# Altium footprint library Tomra_Cadstar_Footprints.PcbLib: 380 footprints (part 13 of 24)
Each footprint in its own frame and in the unit in brackets; x right, y up, seen from the top. Pads: shape width x height; smd on the part's side, far side on the other; paste and mask are expansions set on the pad; w line width, h text height; cw(c..) or ccw(c..) is an arc to the next point about the centre after c.
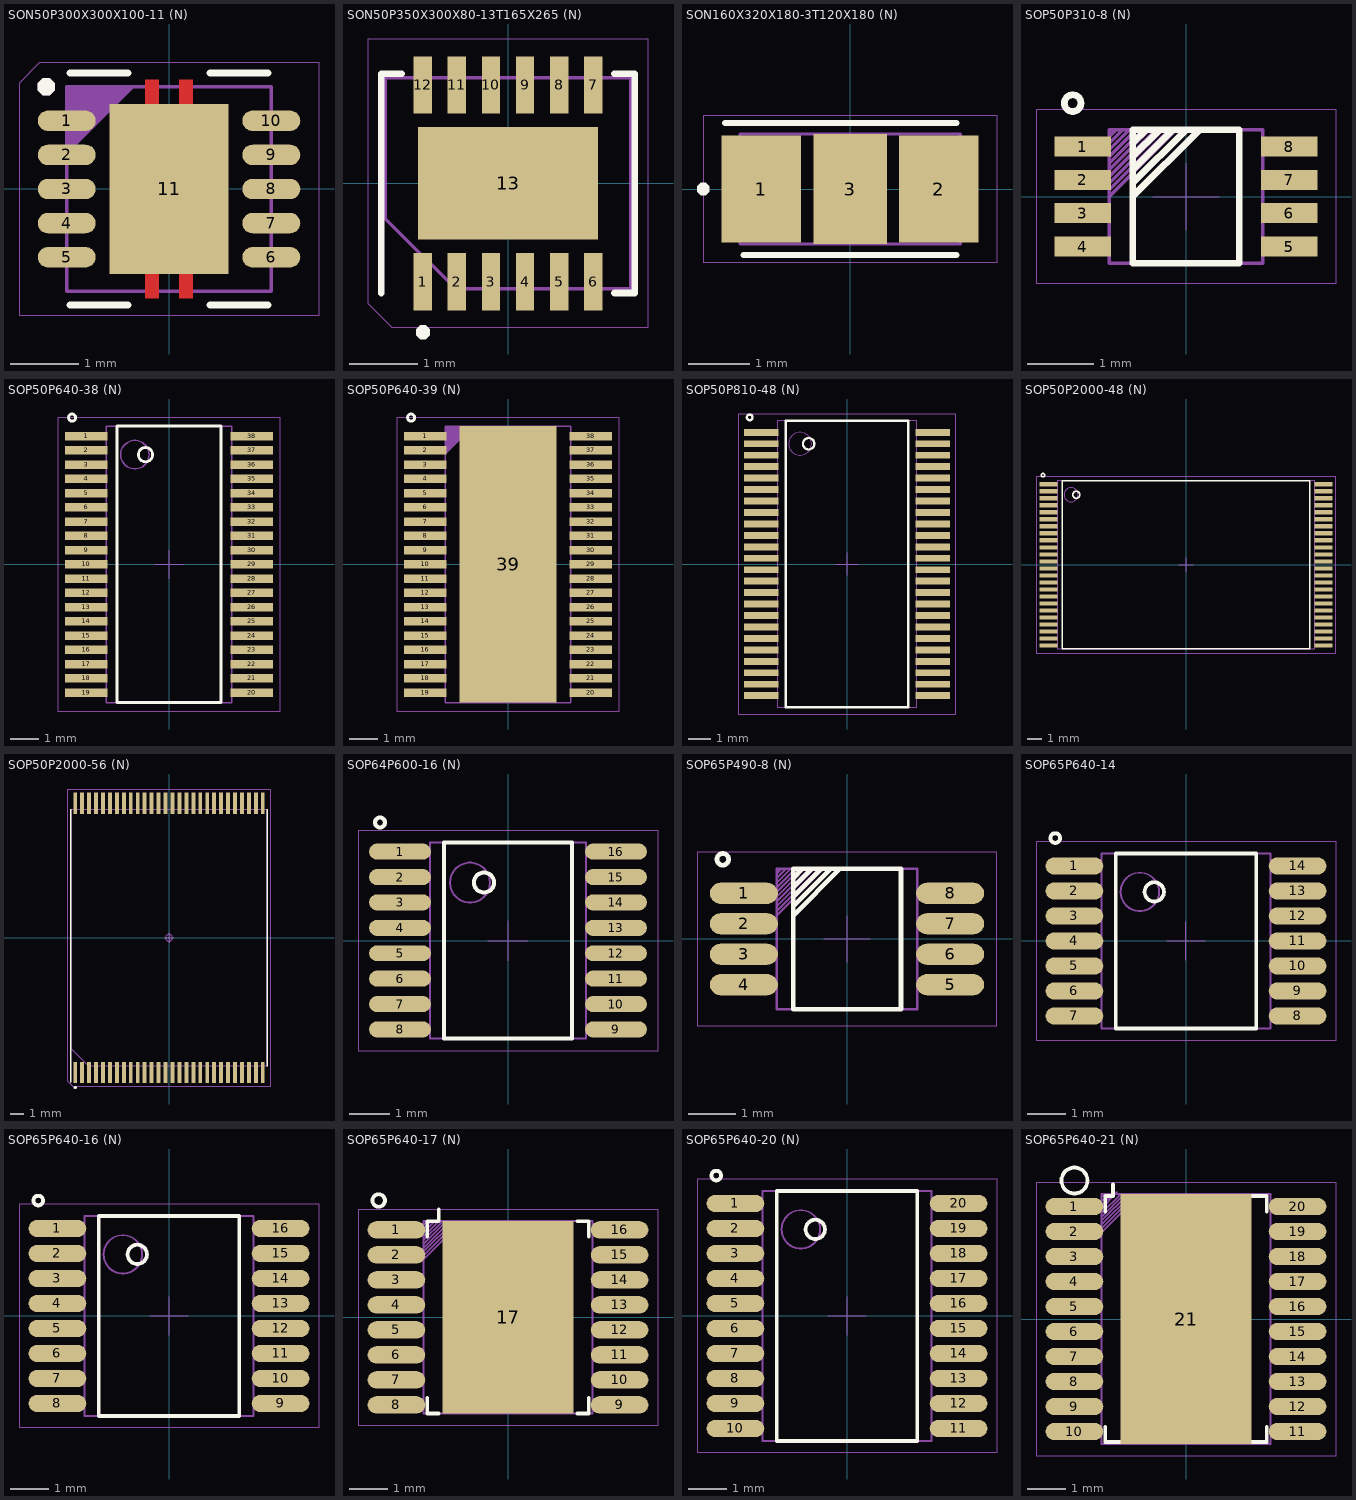
[diagram p12: the footprints below, top view; thin cyan lines are the x and y axes]

## SON50P300X300X100-11 (N) [mm]
height 1
pads (11):
  oval 0.85x0.3 smd paste+0 mask+0: 1(-1.5,1) 2(-1.5,0.5) 3(-1.5,0) 4(-1.5,-0.5) 5(-1.5,-1) 6(1.5,-1) 7(1.5,-0.5) 8(1.5,0) 9(1.5,0.5) 10(1.5,1)
  rect 1.75x2.5 smd paste-0.75 mask+0: 11(0,0)
Top Elec:
  region: -0.8,-1.15 -0.35,-1.15 -0.35,-1.6 -0.15,-1.6 -0.15,-1.15 0.15,-1.15 0.15,-1.6 0.35,-1.6 0.35,-1.15 0.8,-1.15 0.8,1.15 0.35,1.15 0.35,1.6 0.15,1.6 0.15,1.15 -0.15,1.15 -0.15,1.6 -0.35,1.6 -0.35,1.15 -0.8,1.15
Top Silk:
  region: -1.925,1.5 -1.925,1.552 -1.852,1.625 -1.748,1.625 -1.675,1.552 -1.675,1.5 -1.675,1.448 -1.748,1.375 -1.852,1.375 -1.925,1.448
  lines w0.1: -1.45,-1.7 -0.6,-1.7 ; -1.45,1.7 -0.6,1.7 ; 0.6,-1.7 1.45,-1.7 ; 0.6,1.7 1.45,1.7
  text ".Designator" at -3.599,-0.35 h0.7
Top Solder Resist:
  region: -0.8,-1.15 -0.35,-1.15 -0.35,-1.6 -0.15,-1.6 -0.15,-1.15 0.15,-1.15 0.15,-1.6 0.35,-1.6 0.35,-1.15 0.8,-1.15 0.8,1.15 0.35,1.15 0.35,1.6 0.15,1.6 0.15,1.15 -0.15,1.15 -0.15,1.6 -0.35,1.6 -0.35,1.15 -0.8,1.15
Top Assembly:
  region: -1.5,1.5 -0.5,1.5 -1.5,0.5
  region: -1.925,1.5 -1.925,1.552 -1.852,1.625 -1.748,1.625 -1.675,1.552 -1.675,1.5 -1.675,1.448 -1.748,1.375 -1.852,1.375 -1.925,1.448
  lines w0.05: -1.5,-1.5 -1.5,1.5 1.5,1.5 1.5,-1.5 -1.5,-1.5
Top Placement:
  lines w0.01: -0.5,0 0.5,0 ; 0,-0.5 0,0.5 ; -2.2,-1.85 2.2,-1.85 2.2,1.85 -1.9,1.85 -2.2,1.55 -2.2,-1.85

## SON50P350X300X80-13T165X265 (N) [mm]
height 0.8
pads (13):
  rect 0.27x0.84 smd paste+0 mask+0: 1(-1.25,-1.445) 2(-0.75,-1.445) 3(-0.25,-1.445) 4(0.25,-1.445) 5(0.75,-1.445) 6(1.25,-1.445) 7(1.25,1.445) 8(0.75,1.445) 9(0.25,1.445) 10(-0.25,1.445) 11(-0.75,1.445) 12(-1.25,1.445)
  rect 2.65x1.65 smd paste+0 mask+0: 13(0,0)
Top Silk:
  region: -1.35,-2.185 -1.35,-2.144 -1.291,-2.085 -1.209,-2.085 -1.15,-2.144 -1.15,-2.185 -1.15,-2.226 -1.209,-2.285 -1.291,-2.285 -1.35,-2.226
  lines w0.1: -1.86,-1.61 -1.86,1.61 -1.565,1.61 ; 1.565,-1.61 1.86,-1.61 1.86,1.61 1.565,1.61
  text ".Designator" at -2.05,2.12 h0.7
Top Paste:
  region: 1.13,-0.63 0.1,-0.63 0.1,-0.1 1.13,-0.1
  region: 1.13,0.1 0.1,0.1 0.1,0.63 1.13,0.63
  region: -0.1,-0.63 -1.13,-0.63 -1.13,-0.1 -0.1,-0.1
  region: -0.1,0.1 -1.13,0.1 -1.13,0.63 -0.1,0.63
Top Assembly:
  lines w0.05: -1.8,-0.517 -0.767,-1.55 1.8,-1.55 1.8,1.55 -1.8,1.55 -1.8,-0.517
Top Placement:
  lines w0.01: -2.05,-1.77 -1.7,-2.12 2.05,-2.12 2.05,2.12 -2.05,2.12 -2.05,-1.77
  lines w0.05: -0.35,0 0.35,0 ; 0,-0.35 0,0.35 ; -0.25,0 cw(c0,0) 0.25,0 cw(c0,0) -0.25,0

## SON160X320X180-3T120X180 (N) [mm]
height 1.8
pads (3):
  rrect0% 1.3x1.74 smd paste+0 mask+0: 1(-1.45,0) 2(1.45,0)
  rect 1.2x1.8 smd paste+0 mask+0: 3(0,0)
Top Silk:
  region: -2.4,0.1 -2.359,0.1 -2.3,0.041 -2.3,-0.041 -2.359,-0.1 -2.4,-0.1 -2.441,-0.1 -2.5,-0.041 -2.5,0.041 -2.441,0.1
  lines w0.1: -2.04,1.08 1.74,1.08 ; -1.74,-1.08 1.74,-1.08
  text ".Designator" at -3.599,-0.35 h0.7
Top Paste:
  region: -0.39,-0.76 -0.39,-0.07 0.39,-0.07 0.39,-0.76
  region: -0.39,0.07 -0.39,0.76 0.39,0.76 0.39,0.07
Top Assembly:
  lines w0.05: -1.8,-0.9 -1.8,0.9 1.8,0.9 1.8,-0.9 -1.8,-0.9
Top Placement:
  lines w0.01: -2.4,-1.2 -2.4,1.2 2.4,1.2 2.4,-1.2 -2.4,-1.2
  lines w0.05: 0,-0.25 ccw(c0,0) 0,0.25 ; 0,-0.25 cw(c0,0) 0,0.25 ; 0,-0.25 ccw(c0,0) 0,0.25 ; 0,-0.25 cw(c0,0) 0,0.25 ; -0.35,0 0.35,0 -0.35,0 ; 0,-0.35 0,0.35 0,-0.35

## SOP50P310-8 (N) [mm]
height 0.9
pads (8):
  rect 0.85x0.3 smd paste+0 mask+0: 1(-1.55,0.75) 2(-1.55,0.25) 3(-1.55,-0.25) 4(-1.55,-0.75) 5(1.55,-0.75) 6(1.55,-0.25) 7(1.55,0.25) 8(1.55,0.75)
Top Silk:
  lines w0.1: -0.8,0 0.2,1 ; -0.8,0.2 0,1 ; -0.8,0.4 -0.2,1 ; -0.8,0.6 -0.4,1 ; -0.8,0.8 -0.6,1 ; -1.825,1.4 cw(c-1.7,1.4) -1.575,1.4 cw(c-1.7,1.4) -1.825,1.4 ; -0.8,-1 0.8,-1 0.8,1 -0.8,1 -0.8,-1
  text ".Designator" at -3.599,-0.35 h0.7
Top Assembly:
  lines w0.05: -1.15,0 -0.15,1 ; -1.15,0.1 -0.25,1 ; -1.15,0.2 -0.35,1 ; -1.15,0.3 -0.45,1 ; -1.15,0.4 -0.55,1 ; -1.15,0.5 -0.65,1 ; -1.15,0.6 -0.75,1 ; -1.15,0.7 -0.85,1 ; -1.15,0.8 -0.95,1 ; -1.15,0.9 -1.05,1 ; -1.15,-1 1.15,-1 1.15,1 -1.15,1 -1.15,-1
Top Placement:
  lines w0.01: -0.5,0 0.5,0 ; 0,-0.5 0,0.5 ; -2.25,-1.3 2.25,-1.3 2.25,1.3 -2.25,1.3 -2.25,-1.3

## SOP50P640-38 (N) [mm]
height 1.2
pads (38):
  rect 1.5x0.3 smd paste+0 mask+0: 1(-2.9,4.5) 2(-2.9,4) 3(-2.9,3.5) 4(-2.9,3) 5(-2.9,2.5) 6(-2.9,2) 7(-2.9,1.5) 8(-2.9,1) 9(-2.9,0.5) 10(-2.9,0) 11(-2.9,-0.5) 12(-2.9,-1) 13(-2.9,-1.5) 14(-2.9,-2) 15(-2.9,-2.5) 16(-2.9,-3) 17(-2.9,-3.5) 18(-2.9,-4) 19(-2.9,-4.5) 20(2.9,-4.5) 21(2.9,-4) 22(2.9,-3.5) 23(2.9,-3) 24(2.9,-2.5) 25(2.9,-2) 26(2.9,-1.5) 27(2.9,-1) 28(2.9,-0.5) 29(2.9,0) 30(2.9,0.5) 31(2.9,1) 32(2.9,1.5) 33(2.9,2) 34(2.9,2.5) 35(2.9,3) 36(2.9,3.5) 37(2.9,4) 38(2.9,4.5)
Top Silk:
  lines w0.1: -3.525,5.15 cw(c-3.4,5.15) -3.275,5.15 cw(c-3.4,5.15) -3.525,5.15 ; -1.825,-4.85 1.825,-4.85 1.825,4.85 -1.825,4.85 -1.825,-4.85 ; -1.075,3.85 cw(c-0.825,3.85) -0.575,3.85 cw(c-0.825,3.85) -1.075,3.85
  text ".Designator" at -3.599,-0.35 h0.7
Top Assembly:
  lines w0.05: -2.2,-4.85 2.2,-4.85 2.2,4.85 -2.2,4.85 -2.2,-4.85 ; -1.7,3.85 cw(c-1.2,3.85) -0.7,3.85 cw(c-1.2,3.85) -1.7,3.85
Top Placement:
  lines w0.01: -0.5,0 0.5,0 ; 0,-0.5 0,0.5 ; -3.9,-5.15 3.9,-5.15 3.9,5.15 -3.9,5.15 -3.9,-5.15

## SOP50P640-39 (N) [mm]
height 1.2
pads (39):
  rect 1.5x0.3 smd paste+0 mask+0: 1(-2.9,4.5) 2(-2.9,4) 3(-2.9,3.5) 4(-2.9,3) 5(-2.9,2.5) 6(-2.9,2) 7(-2.9,1.5) 8(-2.9,1) 9(-2.9,0.5) 10(-2.9,0) 11(-2.9,-0.5) 12(-2.9,-1) 13(-2.9,-1.5) 14(-2.9,-2) 15(-2.9,-2.5) 16(-2.9,-3) 17(-2.9,-3.5) 18(-2.9,-4) 19(-2.9,-4.5) 20(2.9,-4.5) 21(2.9,-4) 22(2.9,-3.5) 23(2.9,-3) 24(2.9,-2.5) 25(2.9,-2) 26(2.9,-1.5) 27(2.9,-1) 28(2.9,-0.5) 29(2.9,0) 30(2.9,0.5) 31(2.9,1) 32(2.9,1.5) 33(2.9,2) 34(2.9,2.5) 35(2.9,3) 36(2.9,3.5) 37(2.9,4) 38(2.9,4.5)
  rect 3.4x9.7 smd paste+0 mask+0: 39(0,0)
Top Silk:
  lines w0.1: -3.525,5.15 cw(c-3.4,5.15) -3.275,5.15 cw(c-3.4,5.15) -3.525,5.15
  text ".Designator" at -3.9,5.15 h0.7
Top Assembly:
  region: -2.2,4.85 -2.2,3.85 -1.2,4.85 -1.575,4.85
  lines w0.05: -2.2,-4.85 2.2,-4.85 2.2,4.85 -2.2,4.85 -2.2,-4.85
Top Placement:
  lines w0.01: -0.5,0 0.5,0 ; 0,-0.5 0,0.5 ; -3.9,-5.15 3.9,-5.15 3.9,5.15 -3.9,5.15 -3.9,-5.15

## SOP50P810-48 (N) [mm]
height 1.2
pads (48):
  rect 1.5x0.3 smd paste+0 mask+0: 1(-3.75,5.75) 2(-3.75,5.25) 3(-3.75,4.75) 4(-3.75,4.25) 5(-3.75,3.75) 6(-3.75,3.25) 7(-3.75,2.75) 8(-3.75,2.25) 9(-3.75,1.75) 10(-3.75,1.25) 11(-3.75,0.75) 12(-3.75,0.25) 13(-3.75,-0.25) 14(-3.75,-0.75) 15(-3.75,-1.25) 16(-3.75,-1.75) 17(-3.75,-2.25) 18(-3.75,-2.75) 19(-3.75,-3.25) 20(-3.75,-3.75) 21(-3.75,-4.25) 22(-3.75,-4.75) 23(-3.75,-5.25) 24(-3.75,-5.75) 25(3.75,-5.75) 26(3.75,-5.25) 27(3.75,-4.75) 28(3.75,-4.25) 29(3.75,-3.75) 30(3.75,-3.25) 31(3.75,-2.75) 32(3.75,-2.25) 33(3.75,-1.75) 34(3.75,-1.25) 35(3.75,-0.75) 36(3.75,-0.25) 37(3.75,0.25) 38(3.75,0.75) 39(3.75,1.25) 40(3.75,1.75) 41(3.75,2.25) 42(3.75,2.75) 43(3.75,3.25) 44(3.75,3.75) 45(3.75,4.25) 46(3.75,4.75) 47(3.75,5.25) 48(3.75,5.75)
Top Silk:
  lines w0.1: -4.375,6.4 cw(c-4.25,6.4) -4.125,6.4 cw(c-4.25,6.4) -4.375,6.4 ; -2.675,-6.25 2.675,-6.25 2.675,6.25 -2.675,6.25 -2.675,-6.25 ; -1.925,5.25 cw(c-1.675,5.25) -1.425,5.25 cw(c-1.675,5.25) -1.925,5.25
  text ".Designator" at -3.599,-0.35 h0.7
Top Assembly:
  lines w0.05: -3.05,-6.25 3.05,-6.25 3.05,6.25 -3.05,6.25 -3.05,-6.25 ; -2.55,5.25 cw(c-2.05,5.25) -1.55,5.25 cw(c-2.05,5.25) -2.55,5.25
Top Placement:
  lines w0.01: -0.5,0 0.5,0 ; 0,-0.5 0,0.5 ; -4.75,-6.55 4.75,-6.55 4.75,6.55 -4.75,6.55 -4.75,-6.55

## SOP50P2000-48 (N) [mm]
height 1.2
pads (48):
  rect 1.3x0.3 smd paste+0 mask+0: 1(-9.8,5.75) 2(-9.8,5.25) 3(-9.8,4.75) 4(-9.8,4.25) 5(-9.8,3.75) 6(-9.8,3.25) 7(-9.8,2.75) 8(-9.8,2.25) 9(-9.8,1.75) 10(-9.8,1.25) 11(-9.8,0.75) 12(-9.8,0.25) 13(-9.8,-0.25) 14(-9.8,-0.75) 15(-9.8,-1.25) 16(-9.8,-1.75) 17(-9.8,-2.25) 18(-9.8,-2.75) 19(-9.8,-3.25) 20(-9.8,-3.75) 21(-9.8,-4.25) 22(-9.8,-4.75) 23(-9.8,-5.25) 24(-9.8,-5.75) 25(9.8,-5.75) 26(9.8,-5.25) 27(9.8,-4.75) 28(9.8,-4.25) 29(9.8,-3.75) 30(9.8,-3.25) 31(9.8,-2.75) 32(9.8,-2.25) 33(9.8,-1.75) 34(9.8,-1.25) 35(9.8,-0.75) 36(9.8,-0.25) 37(9.8,0.25) 38(9.8,0.75) 39(9.8,1.25) 40(9.8,1.75) 41(9.8,2.25) 42(9.8,2.75) 43(9.8,3.25) 44(9.8,3.75) 45(9.8,4.25) 46(9.8,4.75) 47(9.8,5.25) 48(9.8,5.75)
Top Silk:
  lines w0.1: -10.325,6.4 cw(c-10.2,6.4) -10.075,6.4 cw(c-10.2,6.4) -10.325,6.4 ; -8.825,-6 8.825,-6 8.825,6 -8.825,6 -8.825,-6 ; -8.075,5 cw(c-7.825,5) -7.575,5 cw(c-7.825,5) -8.075,5
  text ".Designator" at -8.825,6 h0.7
Top Assembly:
  lines w0.05: -9.2,-6 9.2,-6 9.2,6 -9.2,6 -9.2,-6 ; -8.7,5 cw(c-8.2,5) -7.7,5 cw(c-8.2,5) -8.7,5
Top Placement:
  lines w0.01: -0.5,0 0.5,0 ; 0,-0.5 0,0.5 ; -10.7,-6.3 10.7,-6.3 10.7,6.3 -10.7,6.3 -10.7,-6.3

## SOP50P2000-56 (N) [mm]
height 1.2
pads (56):
  rect 0.28x1.54 smd paste+0 mask+0: 1(-6.75,-9.69) 2(-6.25,-9.69) 3(-5.75,-9.69) 4(-5.25,-9.69) 5(-4.75,-9.69) 6(-4.25,-9.69) 7(-3.75,-9.69) 8(-3.25,-9.69) 9(-2.75,-9.69) 10(-2.25,-9.69) 11(-1.75,-9.69) 12(-1.25,-9.69) 13(-0.75,-9.69) 14(-0.25,-9.69) 15(0.25,-9.69) 16(0.75,-9.69) 17(1.25,-9.69) 18(1.75,-9.69) 19(2.25,-9.69) 20(2.75,-9.69) 21(3.25,-9.69) 22(3.75,-9.69) 23(4.25,-9.69) 24(4.75,-9.69) 25(5.25,-9.69) 26(5.75,-9.69) 27(6.25,-9.69) 28(6.75,-9.69) 29(6.75,9.69) 30(6.25,9.69) 31(5.75,9.69) 32(5.25,9.69) 33(4.75,9.69) 34(4.25,9.69) 35(3.75,9.69) 36(3.25,9.69) 37(2.75,9.69) 38(2.25,9.69) 39(1.75,9.69) 40(1.25,9.69) 41(0.75,9.69) 42(0.25,9.69) 43(-0.25,9.69) 44(-0.75,9.69) 45(-1.25,9.69) 46(-1.75,9.69) 47(-2.25,9.69) 48(-2.75,9.69) 49(-3.25,9.69) 50(-3.75,9.69) 51(-4.25,9.69) 52(-4.75,9.69) 53(-5.25,9.69) 54(-5.75,9.69) 55(-6.25,9.69) 56(-6.75,9.69)
Top Silk:
  region: -6.85,-10.78 -6.85,-10.739 -6.791,-10.68 -6.709,-10.68 -6.65,-10.739 -6.65,-10.78 -6.65,-10.821 -6.709,-10.88 -6.791,-10.88 -6.85,-10.821
  lines w0.1: -7.07,-10.4 -7.07,9.25 ; 7.07,-9.25 7.07,9.25
  text ".Designator" at 0,0 h0.7
Top Assembly:
  lines w0.05: -7.05,-7.98 -5.78,-9.25 7.05,-9.25 7.05,9.25 -7.05,9.25 -7.05,-7.98
Top Placement:
  lines w0.01: -7.3,-10.31 -6.9,-10.71 7.3,-10.71 7.3,10.71 -7.3,10.71 -7.3,-10.31
  lines w0.05: -0.35,0 0.35,0 ; 0,-0.35 0,0.35 ; -0.25,0 cw(c0,0) 0.25,0 cw(c0,0) -0.25,0

## SOP64P600-16 (N) [mm]
height 1.75
pads (16):
  oval 1.55x0.4 smd paste+0 mask+0: 1(-2.7,2.222) 2(-2.7,1.587) 3(-2.7,0.953) 4(-2.7,0.318) 5(-2.7,-0.318) 6(-2.7,-0.953) 7(-2.7,-1.587) 8(-2.7,-2.222) 9(2.7,-2.222) 10(2.7,-1.587) 11(2.7,-0.953) 12(2.7,-0.318) 13(2.7,0.318) 14(2.7,0.953) 15(2.7,1.587) 16(2.7,2.222)
Top Silk:
  lines w0.1: -3.325,2.95 cw(c-3.2,2.95) -3.075,2.95 cw(c-3.2,2.95) -3.325,2.95 ; -1.6,-2.45 1.6,-2.45 1.6,2.45 -1.6,2.45 -1.6,-2.45 ; -0.85,1.45 cw(c-0.6,1.45) -0.35,1.45 cw(c-0.6,1.45) -0.85,1.45
  text ".Designator" at -3.599,-0.35 h0.7
Top Assembly:
  lines w0.05: -1.95,-2.448 1.95,-2.448 1.95,2.447 -1.95,2.447 -1.95,-2.448 ; -1.45,1.448 cw(c-0.95,1.448) -0.45,1.448 cw(c-0.95,1.448) -1.45,1.448
Top Placement:
  lines w0.01: -0.5,0 0.5,0 ; 0,-0.5 0,0.5 ; -3.75,-2.75 3.75,-2.75 3.75,2.75 -3.75,2.75 -3.75,-2.75

## SOP65P490-8 (N) [mm]
height 0.95
pads (8):
  oval 1.45x0.45 smd paste+0 mask+0: 1(-2.2,0.975) 2(-2.2,0.325) 3(-2.2,-0.325) 4(-2.2,-0.975) 5(2.2,-0.975) 6(2.2,-0.325) 7(2.2,0.325) 8(2.2,0.975)
Top Silk:
  lines w0.1: -1.15,0.5 -0.15,1.5 ; -1.15,0.7 -0.35,1.5 ; -1.15,0.9 -0.55,1.5 ; -1.15,1.1 -0.75,1.5 ; -1.15,1.3 -0.95,1.5 ; -2.775,1.7 cw(c-2.65,1.7) -2.525,1.7 cw(c-2.65,1.7) -2.775,1.7 ; -1.15,-1.5 1.15,-1.5 1.15,1.5 -1.15,1.5 -1.15,-1.5
  text ".Designator" at -3.599,-0.35 h0.7
Top Assembly:
  lines w0.05: -1.5,0.5 -0.5,1.5 ; -1.5,0.6 -0.6,1.5 ; -1.5,0.7 -0.7,1.5 ; -1.5,0.8 -0.8,1.5 ; -1.5,0.9 -0.9,1.5 ; -1.5,1 -1,1.5 ; -1.5,1.1 -1.1,1.5 ; -1.5,1.2 -1.2,1.5 ; -1.5,1.3 -1.3,1.5 ; -1.5,1.4 -1.4,1.5 ; -1.5,-1.5 -1.5,1.5 1.5,1.5 1.5,-1.5 -1.5,-1.5
Top Placement:
  lines w0.01: -0.5,0 0.5,0 ; 0,-0.5 0,0.5 ; -3.2,-1.85 3.2,-1.85 3.2,1.85 -3.2,1.85 -3.2,-1.85

## SOP65P640-14 [mm]
height 1.1
pads (14):
  oval 1.5x0.45 smd paste+0 mask+0: 1(-2.9,1.95) 2(-2.9,1.3) 3(-2.9,0.65) 4(-2.9,0) 5(-2.9,-0.65) 6(-2.9,-1.3) 7(-2.9,-1.95) 8(2.9,-1.95) 9(2.9,-1.3) 10(2.9,-0.65) 11(2.9,0) 12(2.9,0.65) 13(2.9,1.3) 14(2.9,1.95)
Top Silk:
  lines w0.1: -3.525,2.675 cw(c-3.4,2.675) -3.275,2.675 cw(c-3.4,2.675) -3.525,2.675 ; -1.825,-2.275 1.825,-2.275 1.825,2.275 -1.825,2.275 -1.825,-2.275 ; -1.075,1.275 cw(c-0.825,1.275) -0.575,1.275 cw(c-0.825,1.275) -1.075,1.275
  text ".Designator" at -3.594,-0.35 h0.7
Top Assembly:
  lines w0.05: -2.2,-2.275 2.2,-2.275 2.2,2.275 -2.2,2.275 -2.2,-2.275 ; -1.7,1.275 cw(c-1.2,1.275) -0.7,1.275 cw(c-1.2,1.275) -1.7,1.275
Top Placement:
  lines w0.01: -0.505,0 0.495,0 ; -0.005,-0.5 -0.005,0.5 ; -3.9,-2.58 3.9,-2.58 3.9,2.575 -3.9,2.575 -3.9,-2.58

## SOP65P640-16 (N) [mm]
height 1.5
pads (16):
  oval 1.5x0.45 smd paste+0 mask+0: 1(-2.9,2.275) 2(-2.9,1.625) 3(-2.9,0.975) 4(-2.9,0.325) 5(-2.9,-0.325) 6(-2.9,-0.975) 7(-2.9,-1.625) 8(-2.9,-2.275) 9(2.9,-2.275) 10(2.9,-1.625) 11(2.9,-0.975) 12(2.9,-0.325) 13(2.9,0.325) 14(2.9,0.975) 15(2.9,1.625) 16(2.9,2.275)
Top Silk:
  lines w0.1: -3.525,3 cw(c-3.4,3) -3.275,3 cw(c-3.4,3) -3.525,3 ; -1.825,-2.6 1.825,-2.6 1.825,2.6 -1.825,2.6 -1.825,-2.6 ; -1.075,1.6 cw(c-0.825,1.6) -0.575,1.6 cw(c-0.825,1.6) -1.075,1.6
  text ".Designator" at -3.599,-0.35 h0.7
Top Assembly:
  lines w0.05: -2.2,-2.6 2.2,-2.6 2.2,2.6 -2.2,2.6 -2.2,-2.6 ; -1.7,1.6 cw(c-1.2,1.6) -0.7,1.6 cw(c-1.2,1.6) -1.7,1.6
Top Placement:
  lines w0.01: -0.5,0 0.5,0 ; 0,-0.5 0,0.5 ; -3.9,-2.9 3.9,-2.9 3.9,2.9 -3.9,2.9 -3.9,-2.9

## SOP65P640-17 (N) [mm]
height 1.2
pads (17):
  oval 1.5x0.45 smd paste+0 mask+0: 1(-2.9,2.275) 2(-2.9,1.625) 3(-2.9,0.975) 4(-2.9,0.325) 5(-2.9,-0.325) 6(-2.9,-0.975) 7(-2.9,-1.625) 8(-2.9,-2.275) 9(2.9,-2.275) 10(2.9,-1.625) 11(2.9,-0.975) 12(2.9,-0.325) 13(2.9,0.325) 14(2.9,0.975) 15(2.9,1.625) 16(2.9,2.275)
  rect 3.4x5 smd paste+0 mask+0: 17(0,0)
Top Silk:
  lines w0.1: -2.1,2.1 -2.1,2.5 -1.8,2.5 -1.8,2.8 ; 1.8,-2.5 2.1,-2.5 2.1,-2.1 ; 1.8,2.5 2.1,2.5 2.1,2.1 ; -2.1,-2.5 -1.8,-2.5 -2.1,-2.5 ; -2.1,-2.5 -2.1,-2.1 -2.1,-2.5 ; -3.525,3.037 cw(c-3.363,3.037) -3.2,3.037 cw(c-3.363,3.037) -3.525,3.037
  text ".Designator" at -3.599,-0.35 h0.7
Top Assembly:
  lines w0.05: -2.2,1.5 -1.2,2.5 ; -2.2,1.6 -1.3,2.5 ; -2.2,1.7 -1.4,2.5 ; -2.2,1.8 -1.5,2.5 ; -2.2,1.9 -1.6,2.5 ; -2.2,2 -1.7,2.5 ; -2.2,2.1 -1.8,2.5 ; -2.2,2.2 -1.9,2.5 ; -2.2,2.3 -2,2.5 ; -2.2,2.4 -2.1,2.5 ; -2.2,-2.5 2.2,-2.5 2.2,2.5 -2.2,2.5 -2.2,-2.5
Top Placement:
  lines w0.01: -0.5,0 0.5,0 ; 0,-0.5 0,0.5 ; -3.9,-2.8 3.9,-2.8 3.9,2.8 -3.9,2.8 -3.9,-2.8

## SOP65P640-20 (N) [mm]
height 1.5
pads (20):
  oval 1.5x0.45 smd paste+0 mask+0: 1(-2.9,2.925) 2(-2.9,2.275) 3(-2.9,1.625) 4(-2.9,0.975) 5(-2.9,0.325) 6(-2.9,-0.325) 7(-2.9,-0.975) 8(-2.9,-1.625) 9(-2.9,-2.275) 10(-2.9,-2.925) 11(2.9,-2.925) 12(2.9,-2.275) 13(2.9,-1.625) 14(2.9,-0.975) 15(2.9,-0.325) 16(2.9,0.325) 17(2.9,0.975) 18(2.9,1.625) 19(2.9,2.275) 20(2.9,2.925)
Top Silk:
  lines w0.1: -3.525,3.65 cw(c-3.4,3.65) -3.275,3.65 cw(c-3.4,3.65) -3.525,3.65 ; -1.825,-3.25 1.825,-3.25 1.825,3.25 -1.825,3.25 -1.825,-3.25 ; -1.075,2.25 cw(c-0.825,2.25) -0.575,2.25 cw(c-0.825,2.25) -1.075,2.25
  text ".Designator" at -3.599,-0.35 h0.7
Top Assembly:
  lines w0.05: -2.2,-3.25 2.2,-3.25 2.2,3.25 -2.2,3.25 -2.2,-3.25 ; -1.7,2.25 cw(c-1.2,2.25) -0.7,2.25 cw(c-1.2,2.25) -1.7,2.25
Top Placement:
  lines w0.01: -0.5,0 0.5,0 ; 0,-0.5 0,0.5 ; -3.9,-3.55 3.9,-3.55 3.9,3.55 -3.9,3.55 -3.9,-3.55

## SOP65P640-21 (N) [mm]
height 1.2
pads (21):
  oval 1.5x0.45 smd paste+0 mask+0: 1(-2.9,2.925) 2(-2.9,2.275) 3(-2.9,1.625) 4(-2.9,0.975) 5(-2.9,0.325) 6(-2.9,-0.325) 7(-2.9,-0.975) 8(-2.9,-1.625) 9(-2.9,-2.275) 10(-2.9,-2.925) 11(2.9,-2.925) 12(2.9,-2.275) 13(2.9,-1.625) 14(2.9,-0.975) 15(2.9,-0.325) 16(2.9,0.325) 17(2.9,0.975) 18(2.9,1.625) 19(2.9,2.275) 20(2.9,2.925)
  rect 3.4x6.5 smd paste+0 mask+0: 21(0,0)
Top Silk:
  lines w0.1: -2.1,-2.8 -2.1,-3.2 -1.7,-3.2 ; -2.1,2.8 -2.1,3.2 -1.9,3.2 -1.9,3.5 ; 1.7,-3.2 2.1,-3.2 2.1,-2.8 ; 1.7,3.2 2.1,3.2 2.1,2.8 ; -3.238,3.6 cw(c-2.9,3.6) -2.563,3.6 cw(c-2.9,3.6) -3.238,3.6
  text ".Designator" at -3.599,-0.35 h0.7
Top Assembly:
  lines w0.05: -2.2,2.25 -1.2,3.25 ; -2.2,2.35 -1.3,3.25 ; -2.2,2.45 -1.4,3.25 ; -2.2,2.55 -1.5,3.25 ; -2.2,2.65 -1.6,3.25 ; -2.2,2.75 -1.7,3.25 ; -2.2,2.85 -1.8,3.3 ; -2.2,2.95 -1.9,3.25 ; -2.2,3.05 -2,3.25 ; -2.2,3.15 -2.1,3.25 ; -2.2,-3.25 2.2,-3.25 2.2,3.25 -2.2,3.25 -2.2,-3.25
Top Placement:
  lines w0.01: -0.5,0 0.5,0 ; 0,-0.5 0,0.5 ; -3.9,-3.55 3.9,-3.55 3.9,3.55 -3.9,3.55 -3.9,-3.55